# Altium footprint library Connectors.PcbLib: 74 footprints (part 5 of 5)
Each footprint in its own frame and in the unit in brackets; x right, y up, seen from the top. Pads: shape width x height; smd on the part's side, far side on the other; paste and mask are expansions set on the pad; w line width, h text height; cw(c..) or ccw(c..) is an arc to the next point about the centre after c.
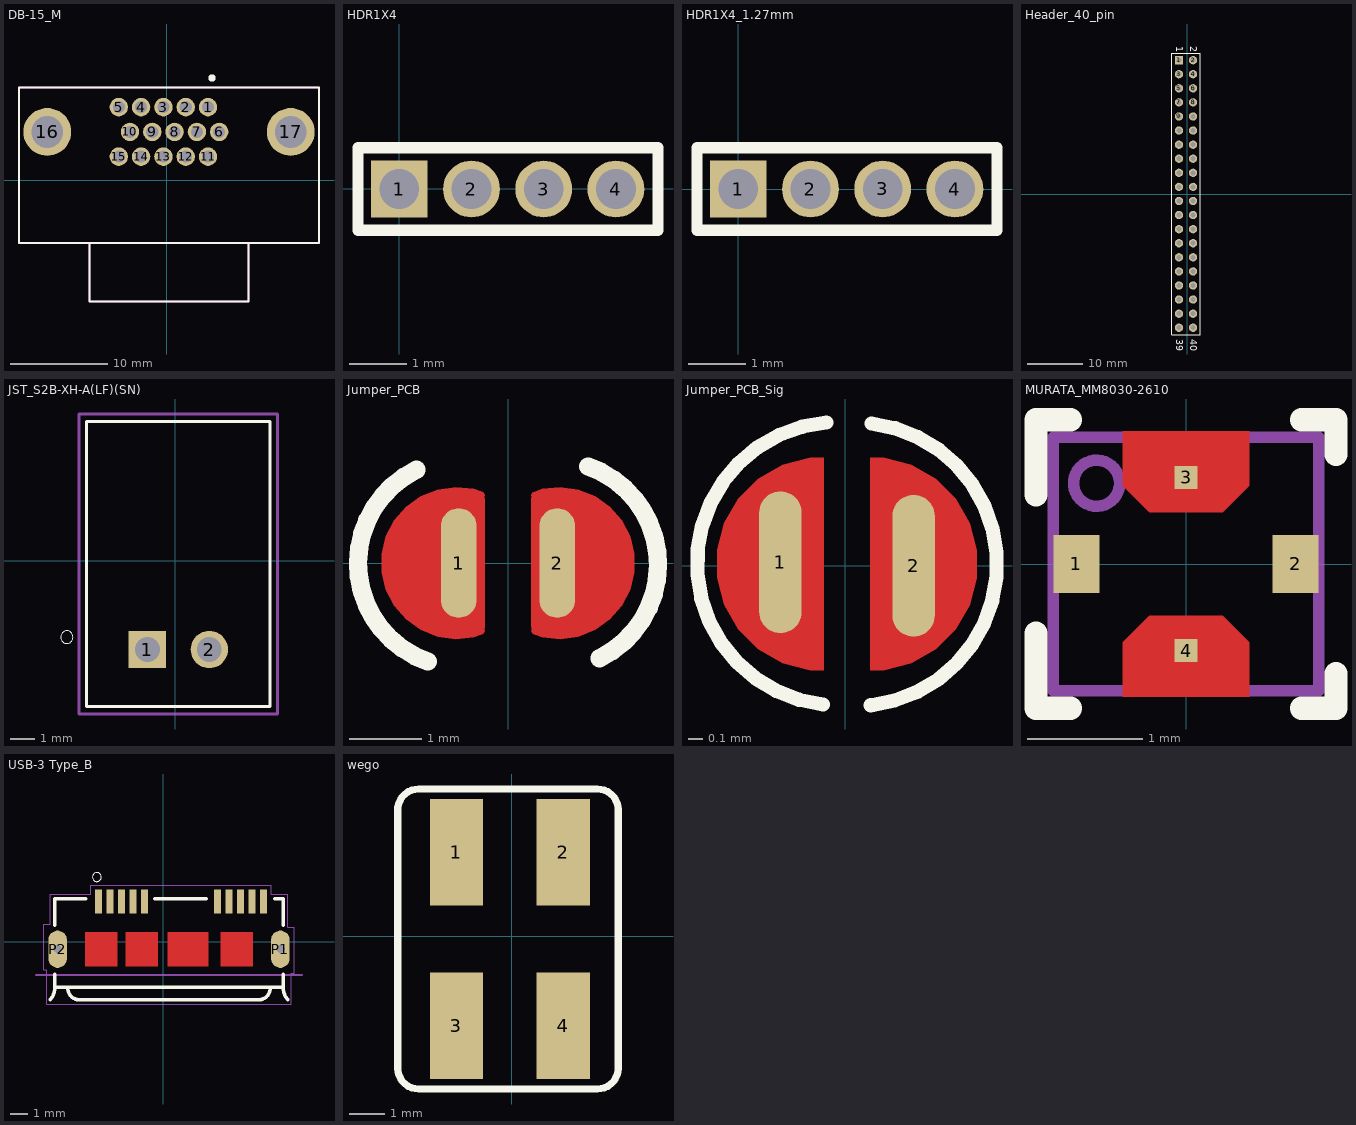
[diagram p4: the footprints below, top view; thin cyan lines are the x and y axes]

## DB-15_M [mm]
pads (17):
  round 1.89 hole 1.24: 1(4.25,7.501) 2(1.96,7.501) 3(-0.33,7.501) 4(-2.62,7.501) 5(-4.909,7.501) 6(5.395,4.961) 7(3.106,4.961) 8(0.816,4.961) 9(-1.475,4.961) 10(-3.765,4.961) 11(4.25,2.421) 12(1.96,2.421) 13(-0.33,2.421) 14(-2.62,2.421) 15(-4.909,2.421)
  round 4.91 hole 3.26: 16(-12.252,4.961) 17(12.738,4.961)
Top Overlay:
  circle w0.4: c4.667,10.49 r0.174
  lines w0.2: -7.907,-6.469 -7.907,-12.469 8.393,-12.469 8.393,-6.469 ; -15.157,-6.469 -15.157,9.531 15.643,9.531 15.643,-6.469 -15.157,-6.469
Mechanical 15:
  lines w0.2: -7.907,-6.469 -7.907,-12.469 8.393,-12.469 8.393,-6.469 ; -15.157,-6.469 15.643,-6.469 15.643,9.531 -15.157,9.531 -15.157,-6.469

## HDR1X4 [mm] "Connector; Header; 4 Position"
pads (4):
  rect 1x1 hole 0.7: 1(0,0)
  round 1 hole 0.7: 2(1.27,0) 3(2.54,0) 4(3.81,0)
Top Overlay:
  lines w0.2: -0.725,-0.725 -0.725,0.725 4.55,0.725 4.55,-0.725 -0.725,-0.725

## HDR1X4_1.27mm [mm] "Connector; Header; 4 Position"
pads (4):
  rect 1x1 hole 0.7: 1(0,0)
  round 1 hole 0.7: 2(1.27,0) 3(2.54,0) 4(3.81,0)
Top Overlay:
  lines w0.2: -0.725,-0.725 -0.725,0.725 4.55,0.725 4.55,-0.725 -0.725,-0.725

## Header_40_pin [mm]
pads (40):
  rect 1.5x1.5 hole 0.9: 1(-1.54,24.22)
  round 1.5 hole 0.9: 2(1,24.22) 3(-1.54,21.68) 4(1,21.68) 5(-1.54,19.14) 6(1,19.14) 7(-1.54,16.6) 8(1,16.6) 9(-1.54,14.06) 10(1,14.06) 11(-1.54,11.52) 12(1,11.52) 13(-1.54,8.98) 14(1,8.98) 15(-1.54,6.44) 16(1,6.44) 17(-1.54,3.9) 18(1,3.9) 19(-1.54,1.36) 20(1,1.36) 21(-1.54,-1.18) 22(1,-1.18) 23(-1.54,-3.72) 24(1,-3.72) 25(-1.54,-6.26) 26(1,-6.26) 27(-1.54,-8.8) 28(1,-8.8) 29(-1.54,-11.34) 30(1,-11.34) 31(-1.54,-13.88) 32(1,-13.88) 33(-1.54,-16.42) 34(1,-16.42) 35(-1.54,-18.96) 36(1,-18.96) 37(-1.54,-21.5) 38(1,-21.5) 39(-1.54,-24.04) 40(1,-24.04)
Top Overlay:
  lines w0.2: -2.81,-25.31 2.27,-25.31 2.27,25.49 -2.81,25.49 -2.81,-25.31
  text "39" at -2.048,-26.072 h1.27
  text "40" at 0.492,-26.072 h1.27
  text "2" at 0.492,26.76 h1.27
  text "1" at -2.048,26.76 h1.27

## JST_S2B-XH-A(LF)(SN) [mm]
pads (2):
  rect 1.508x1.508 hole 1: 1(-1.133,-3.586)
  round 1.508 hole 1: 2(1.367,-3.586)
Top Overlay:
  circle w0: c-4.383,-3.086 r0.254
  lines w0.127: -3.583,-5.886 -3.583,5.614 3.817,5.614 3.817,-5.886 -3.583,-5.886
Mechanical 1:
  lines w0.127: -3.883,-6.186 -3.883,5.914 4.117,5.914 4.117,-6.186 -3.883,-6.186

## Jumper_PCB [mil]
pads (2):
  oval 19.68x60 smd: 1(-27,0) 2(27,0)
Top Layer:
  region: 14.16,38.97 18.84,40.63 28.71,41.64 38.55,40.29 47.79,36.65 55.9,30.93 62.43,23.44 67,14.63 69.35,4.98 69.36,-4.94 67.01,-14.59 62.45,-23.41 55.93,-30.9 47.82,-36.63 38.59,-40.28 28.75,-41.64 18.87,-40.64 14.19,-38.98 13.9,-38.88 13.41,-38.51 13.06,-38 12.87,-37.42 12.87,-37.11 12.87,-36.99 12.9,-36.74 12.97,-36.49 13.06,-36.26 13.12,-36.15 13.06,-36.04 12.97,-35.81 12.9,-35.57 12.87,-35.32 12.87,-35.19 12.87,35.67 12.87,35.76 12.89,35.93 12.92,36.1 12.96,36.26 12.99,36.34 12.95,36.43 12.89,36.62 12.86,36.81 12.84,37 12.84,37.1 12.84,37.41 13.02,37.99 13.38,38.49 13.87,38.87
  region: -14.16,-38.97 -18.84,-40.63 -28.71,-41.64 -38.55,-40.29 -47.79,-36.65 -55.9,-30.93 -62.43,-23.44 -67,-14.63 -69.35,-4.98 -69.36,4.94 -67.01,14.59 -62.45,23.41 -55.93,30.9 -47.82,36.63 -38.59,40.28 -28.75,41.64 -18.87,40.64 -14.19,38.98 -13.9,38.88 -13.41,38.51 -13.06,38 -12.87,37.42 -12.87,37.11 -12.87,36.99 -12.9,36.74 -12.97,36.49 -13.06,36.26 -13.12,36.15 -13.06,36.04 -12.97,35.81 -12.9,35.57 -12.87,35.32 -12.87,35.19 -12.87,-35.67 -12.87,-35.76 -12.89,-35.93 -12.92,-36.1 -12.96,-36.26 -12.99,-36.34 -12.95,-36.43 -12.89,-36.62 -12.86,-36.81 -12.84,-37 -12.84,-37.1 -12.84,-37.41 -13.02,-37.99 -13.38,-38.49 -13.87,-38.87
Top Overlay:
  lines w10: -50.14,51.23 ccw(c-25.17,-0.1) -44.02,-53.99 ; 44.02,52.99 cw(c25.17,-0.9) 50.14,-52.23

## Jumper_PCB_Sig [mm]
pads (2):
  oval 0.3x1 smd: 1(-0.457,0.025) 2(0.483,0)
Top Layer:
  region: 0.178,0.762 0.277,0.762 0.467,0.711 0.638,0.612 0.778,0.473 0.877,0.301 0.928,0.111 0.928,-0.087 0.877,-0.277 0.778,-0.449 0.638,-0.588 0.467,-0.687 0.277,-0.738 0.178,-0.738
  region: -0.152,-0.737 -0.251,-0.737 -0.442,-0.685 -0.613,-0.587 -0.753,-0.447 -0.851,-0.276 -0.902,-0.085 -0.902,0.112 -0.851,0.303 -0.753,0.474 -0.613,0.614 -0.442,0.712 -0.251,0.763 -0.152,0.763
Top Overlay:
  lines w0.1: -0.157,-0.979 cw(c-0.045,0.015) -0.133,1.011 ; 0.18,-0.984 ccw(c0.071,0.01) 0.185,1.004

## MURATA_MM8030-2610 [mm]
pads (4):
  rect 0.4x0.5 smd paste-0.5: 1(-0.95,0) 2(0.95,0)
  rect 0.2x0.2 smd paste-0.2: 3(0,0.75) 4(0,-0.75)
Top Layer:
  region: -0.32,-0.45 -0.55,-0.68 -0.55,-1.15 0.55,-1.15 0.55,-0.68 0.32,-0.45
  region: -0.32,0.45 -0.55,0.68 -0.55,1.15 0.55,1.15 0.55,0.68 0.32,0.45
Top Overlay:
  lines w0.2: -1.3,-0.6 -1.3,-1.25 -1,-1.25 ; -1.3,0.6 -1.3,1.25 -1,1.25 ; 1,-1.25 1.3,-1.25 1.3,-0.95 ; 1,1.25 1.3,1.25 1.3,0.95
Top Paste:
  rectangle: -1.15,-0.175 -0.8,0.175
  rectangle: 0.8,-0.175 1.15,0.175
  rectangle: -0.5,0.65 0.5,1.15
  rectangle: -0.5,-1.15 0.5,-0.65
Mechanical 5:
  circle w0.1: c-0.775,0.7 r0.2
  lines w0.1: -1.15,-1.1 1.15,-1.1 1.15,1.1 -1.15,1.1 -1.15,-1.1
3D body: height 0.5, standoff 0, extent -1.151,-1.101 1.151,1.101
3D body: height 0.53, standoff 0.51, extent -1.151,-1.101 1.151,1.101
3D body: height 0.54, standoff 0.5, extent -0.674,-0.674 0.674,0.674
3D body: height 1, standoff 0.5, extent -0.674,-0.674 0.674,0.674
3D body: height 0.75, standoff 0.5, extent -0.269,-0.269 0.269,0.269
3D body: height 0.53, standoff 0, extent -0.7,0.6 0.7,1.1
3D body: height 0.53, standoff 0, extent -0.7,-1.1 0.7,-0.6
3D body: height 0.53, standoff 0, extent 0.9,-0.4 1.15,0.4
3D body: height 0.53, standoff 0, extent -1.15,-0.4 -0.9,0.4
3D body: height 0.51, standoff 0.5, extent -1.024,0.7 -0.825,0.9

## USB-3 Type_B [mm]
pads (12):
  rect 0.4x1.35 smd: 1(-3.658,2.264) 2(-3.008,2.264) 3(-2.358,2.264) 4(-1.708,2.264) 5(-1.058,2.264) 6(3.042,2.264) 7(3.692,2.264) 8(4.342,2.264) 9(4.992,2.264) 10(5.642,2.264)
  oval 1.05x2.1 hole 0.45: P1(6.592,-0.411) P2(-5.958,-0.411)
Top Layer:
  region: 3.243,0.539 5.042,0.539 5.042,-1.361 3.243,-1.361
  region: 0.242,0.539 2.542,0.539 2.542,-1.361 0.242,-1.361
  region: -2.109,0.539 -0.308,0.539 -0.308,-1.362 -2.109,-1.362
  region: -4.414,0.539 -2.608,0.539 -2.608,-1.362 -4.414,-1.362
Top Overlay:
  circle w0: c-3.747,3.653 r0.254
  lines w0.2: -6.379,-3.257 ccw(c-7.121,-2.565) -6.108,-2.512 ; -6.108,-1.811 -6.108,-2.511 -6.108,-2.561 -5.383,-2.561 6.017,-2.561 6.742,-2.561 6.742,-2.511 6.742,-1.811 ; -6.108,0.939 -6.108,2.439 -4.383,2.439 ; -5.383,-2.566 ccw(c-4.733,-2.611) -4.778,-3.261 ; -4.783,-3.261 5.417,-3.261 ; -0.483,2.439 2.417,2.439 ; 5.412,-3.261 ccw(c5.367,-2.611) 6.017,-2.566 ; 6.267,2.439 6.742,2.439 6.742,0.939 ; 6.742,-2.512 ccw(c7.755,-2.565) 7.013,-3.257
Top Paste:
  region: 3.245,0.539 5.042,0.539 5.042,-1.362 3.245,-1.362
  region: 0.242,0.539 2.542,0.539 2.542,-1.362 0.242,-1.362
  region: -2.109,0.539 -0.308,0.539 -0.308,-1.361 -2.109,-1.361
  region: -4.409,0.539 -2.608,0.539 -2.608,-1.361 -4.409,-1.361
Top Solder:
  region: 3.045,0.689 5.242,0.689 5.242,-1.512 3.045,-1.512
  region: 0.042,0.689 2.742,0.689 2.742,-1.513 0.042,-1.513
  region: -2.259,0.689 -0.158,0.689 -0.158,-1.511 -2.259,-1.511
  region: -4.558,0.689 -2.458,0.689 -2.458,-1.511 -4.558,-1.511
Mechanical 1:
  lines w0: -6.183,-0.811 ccw(c-5.958,-0.811) -5.958,-1.036 ccw(c-5.958,-0.811) -5.733,-0.811 -5.733,-0.011 ccw(c-5.958,-0.011) -5.958,0.214 ccw(c-5.958,-0.011) -6.183,-0.011 -6.183,-0.811 ; 6.367,-0.811 ccw(c6.592,-0.811) 6.592,-1.036 ccw(c6.592,-0.811) 6.817,-0.811 6.817,-0.011 ccw(c6.592,-0.011) 6.592,0.214 ccw(c6.592,-0.011) 6.367,-0.011 6.367,-0.811
  lines w0.05: -6.733,-1.561 -6.733,0.989 -6.383,0.989 -6.383,2.689 -4.083,2.689 -4.083,3.189 6.067,3.189 6.067,2.689 7.017,2.689 7.017,0.839 7.367,0.839 7.367,-1.761 7.217,-1.761 7.217,-3.511 -6.583,-3.511 -6.583,-1.561 -6.733,-1.561
  lines w0.1: -7.183,-1.861 7.817,-1.861
3D body "USB3120-30-A_revD.STEP": height 2.78, standoff -0.95, extent -6.336,-3.521 7.05,2.421

## wego [mm]
pads (4):
  rect 1.5x3 smd: 1(-1.549,2.362) 2(1.448,2.362) 3(-1.549,-2.515) 4(1.448,-2.515)
Top Overlay:
  lines w0.2: -3.2,3.556 cw(c-2.616,3.556) -2.616,4.14 2.413,4.14 cw(c2.413,3.556) 2.997,3.556 2.997,-3.708 cw(c2.413,-3.708) 2.413,-4.293 -2.616,-4.293 cw(c-2.616,-3.708) -3.2,-3.708 -3.2,3.632
3D body "2059-302_998-403.stp": height 2.65, standoff -0.05, extent -3.048,-3.976 2.852,3.874